# Altium footprint library 20210518.PcbLib: 414 footprints (part 3 of 26)
Each footprint in its own frame and in the unit in brackets; x right, y up, seen from the top. Pads: shape width x height; smd on the part's side, far side on the other; paste and mask are expansions set on the pad; w line width, h text height; cw(c..) or ccw(c..) is an arc to the next point about the centre after c.
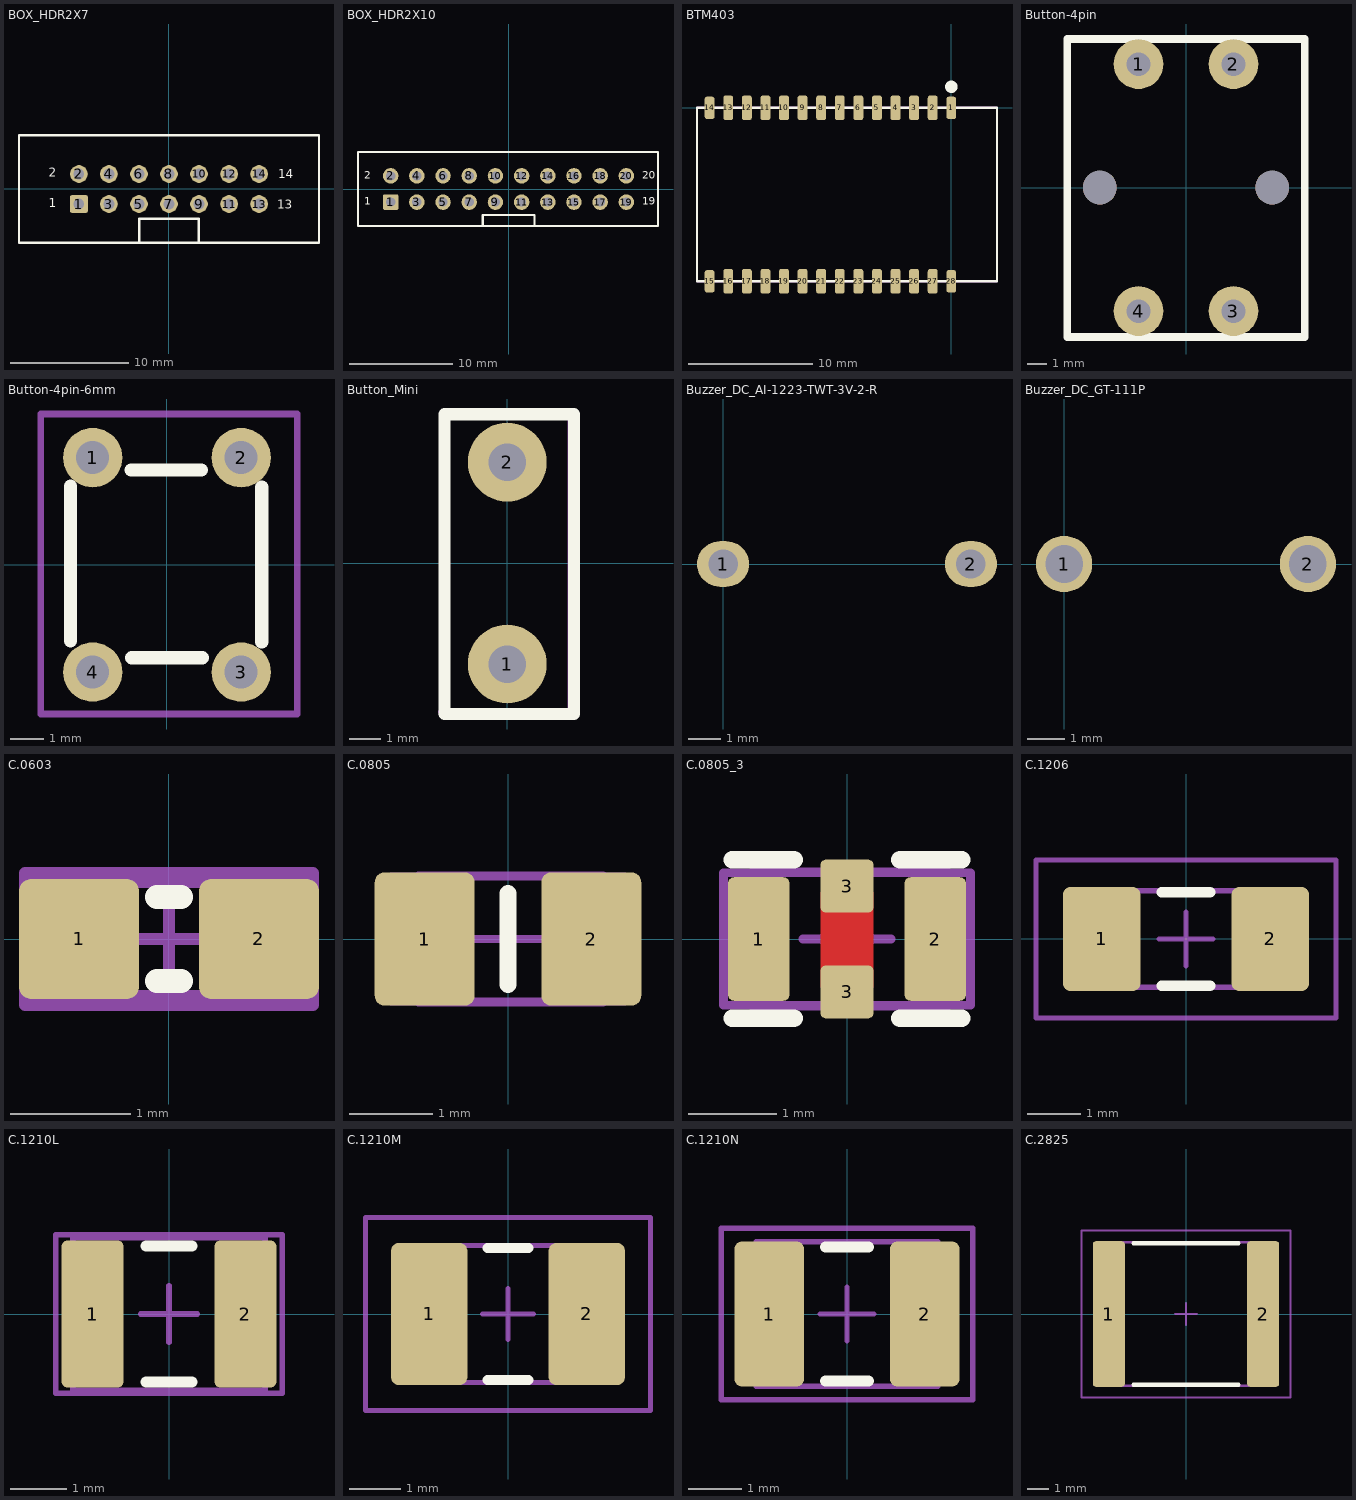
[diagram p2: the footprints below, top view; thin cyan lines are the x and y axes]

## BOX_HDR2X7 [mm] "Connector; Box Header; 7x2 Position"
height 9
pads (14):
  rrect20% 1.5x1.5 hole 0.9: 1(-7.62,-1.27)
  round 1.5 hole 0.9: 2(-7.62,1.27) 3(-5.08,-1.27) 4(-5.08,1.27) 5(-2.54,-1.27) 6(-2.54,1.27) 7(0,-1.27) 8(0,1.27) 9(2.54,-1.27) 10(2.54,1.27) 11(5.08,-1.27) 12(5.08,1.27) 13(7.62,-1.27) 14(7.62,1.27)
Top Overlay:
  lines w0.2: -2.525,-4.55 -2.525,-2.525 2.525,-2.525 2.525,-4.55 ; -12.69,-4.55 -12.69,4.55 -4.975,4.55 12.675,4.55 12.69,4.535 12.69,-4.55 -4.975,-4.55 -12.69,-4.55
  text "2" at -10.16,0.762 h1.27
  text "1" at -10.16,-1.778 h1.27
  text "13" at 9.175,-1.925 h1.27
  text "14" at 9.25,0.65 h1.27
3D body: height 8.8, standoff -3, extent -12.63,-4.5 12.65,4.9

## BOX_HDR2X10 [mm] "Connector; Box Header; 10x2 Position"
height 9
pads (20):
  rrect20% 1.5x1.5 hole 0.9: 1(-11.43,-1.27)
  round 1.5 hole 0.9: 2(-11.43,1.27) 3(-8.89,-1.27) 4(-8.89,1.27) 5(-6.35,-1.27) 6(-6.35,1.27) 7(-3.81,-1.27) 8(-3.81,1.27) 9(-1.27,-1.27) 10(-1.27,1.27) 11(1.27,-1.27) 12(1.27,1.27) 13(3.81,-1.27) 14(3.81,1.27) 15(6.35,-1.27) 16(6.35,1.27) 17(8.89,-1.27) 18(8.89,1.27) 19(11.43,-1.27) 20(11.43,1.27)
Top Overlay:
  lines w0.2: -2.5,-3.6 -2.5,-2.525 2.5,-2.525 2.5,-3.6 ; -14.6,-3.6 -7.835,-3.6 14.5,-3.6 14.5,3.6 -7.835,3.6 -14.6,3.6 -14.6,-3.6
  text "20" at 12.954,0.762 h1.27
  text "19" at 12.954,-1.778 h1.27
  text "1" at -13.97,-1.778 h1.27
  text "2" at -13.97,0.762 h1.27
3D body: height 8.5, standoff -2.6, extent -12.85,-2.525 12.85,2.475

## BTM403 [mm] "Bluetooth Module"
height 2.6
pads (28):
  rrect50% 0.8x1.8 smd: 1(0,0) 14(-19.5,0) 15(-19.5,-14) 28(0,-14)
  rrect50% 0.8x2 smd: 2(-1.5,0) 3(-3,0) 4(-4.5,0) 5(-6,0) 6(-7.5,0) 7(-9,0) 8(-10.5,0) 9(-12,0) 10(-13.5,0) 11(-15,0) 12(-16.5,0) 13(-18,0) 16(-18,-14) 17(-16.5,-14) 18(-15,-14) 19(-13.5,-14) 20(-12,-14) 21(-10.5,-14) 22(-9,-14) 23(-7.5,-14) 24(-6,-14) 25(-4.5,-14) 26(-3,-14) 27(-1.5,-14)
Top Overlay:
  circle w0.6: c0,1.7 r0.2
  lines w0.2: -20.52,-14 -20.52,0 3.69,0 3.69,-14 -20.52,-14
Mechanical 15:
  lines w0.2: -20.52,-14 -20.52,0 3.69,0 3.69,-14 -20.52,-14
3D body: height 2.5, standoff 0, extent -20.4,-14 14.9,0

## Button-4pin [mm] "4pin EKO'da kullanýlan Buton"
pads (6):
  round 2.54 hole 1.2: 1(-2.419,6.29) 2(2.419,6.29) 3(2.419,-6.29) 4(-2.419,-6.29)
  round 1.72 hole 1.72 mask+0: ""(-4.39,0) ""(4.39,0)
Top Overlay:
  lines w0.4: -6.049,-7.615 6.048,-7.615 6.048,7.571 -6.049,7.571 -6.049,-7.615
Mechanical 15:
  lines w0.203: -6.049,-7.715 -6.049,7.571 6.048,7.571 6.048,-7.715 0.517,-7.715 -6.049,-7.715
3D body: height 4.3, standoff -3.5, extent -6.009,-6.873 5.991,6.927

## Button-4pin-6mm [mm] "6mm*6mm button"
pads (4):
  round 1.8 hole 1: 1(-2.25,3.25) 2(2.25,3.25) 3(2.25,-3.25) 4(-2.25,-3.25)
Top Overlay:
  lines w0.4: -2.921,-2.311 -2.921,2.388 ; -1.092,2.87 1.041,2.87 ; -1.067,-2.819 1.067,-2.819 ; 2.87,-2.337 2.87,2.362
Mechanical 15:
  lines w0.203: -3.825,-4.522 -3.825,4.571 3.948,4.571 3.948,-4.522 -3.825,-4.522
3D body: height 5.01, standoff -3.51, extent -3.015,-3.871 3.015,3.872

## Button_Mini [mm]
pads (2):
  round 2.54 / inner round 1.2 / far side round 2.54 hole 1.2: 1(0,-3.25) 2(0,3.25)
Top Overlay:
  lines w0.4: -2.019,-4.855 -2.019,4.787 2.148,4.787 2.148,-4.855 -2.019,-4.855
Mechanical 13:
  lines w0.203: -2.019,-4.835 2.047,-4.835 2.047,4.736 -2.019,4.736 -2.019,-4.835
Mechanical 15:
  lines w0.254: -2.1,-4.8 2.1,-4.8 2.1,4.8 -2,4.8 -2,-4.7
3D body: height 4.26, standoff -0.3, extent -1.4,-3.1 1.6,2.9

## Buzzer_DC_AI-1223-TWT-3V-2-R [mm] "AUDIO MAGNETIC INDICATOR 2-4V TH"
height 7.5
pads (2):
  oval 1.6x1.4 hole 0.9: 1(0,0) 2(7.6,0)
3D body: height 0, standoff -4.5, extent 7.104,-0.499 8.1,0.499
3D body: height 0, standoff -6.5, extent -0.496,-0.499 0.5,0.499
3D body: height 7.6, standoff 0.1, extent -4,-8 12,8

## Buzzer_DC_GT-111P [mm] "AUDIO MAGNETIC XDCR 1-4V TH"
height 8.5
pads (2):
  round 1.5 hole 1: 1(0,0) 2(6.5,0)
3D body: height 10.51, standoff -1.3, extent -2.76,-6.04 9.24,5.96

## C.0603 [mm] "Chip Capacitor, Body 1.6x0.8mm, IPC High Density"
height 0.8
pads (2):
  rrect20% 1x1 smd: 1(-0.75,0) 2(0.75,0)
Top Overlay:
  lines w0.2: -0.1,-0.35 0.1,-0.35 ; -0.1,0.35 0.1,0.35
Mechanical 13:
  lines w0.1: -0.85,-0.475 -0.85,0.475 0.85,0.475 0.85,-0.475 -0.85,-0.475
Mechanical 15:
  lines w0.1: -0.475,0 0.475,0 ; 0,-0.475 0,0.475 ; -1.2,-0.55 -1.2,0.55 1.2,0.55 1.2,-0.55 -1.2,-0.55
3D body: height 0.3, standoff 0, extent -0.8,-0.4 0.8,0.4

## C.0805 [mm] "Chip Capacitor, Body 2.0x1.3mm, IPC High Density"
height 0.8
pads (2):
  rrect20% 1.2x1.6 smd: 1(-1,0) 2(1,0)
Top Overlay:
  lines w0.2: 0,-0.55 0,0.55
Mechanical 13:
  lines w0.1: -1.075,-0.762 -1.075,0.762 1.143,0.762 1.143,-0.762 -1.075,-0.762
Mechanical 15:
  lines w0.1: -0.5,0 0.5,0 ; 0,-0.5 0,0.5 ; -1.4,-0.75 -1.4,0.75 1.4,0.75 1.4,-0.75 -1.4,-0.75
3D body: height 0.78, standoff 0, extent -1,-0.625 1,0.625

## C.0805_3 [mm] "Chip Capacitor, Body 2.0x1.3mm, IPC High Density"
height 0.8
pads (4):
  rrect20% 0.7x1.4 smd: 1(-1,0) 2(1,0)
  rrect20% 0.6x0.6 smd: 3(0,-0.6) 3(0,0.6)
Top Layer:
  lines w0.6: 0,-0.508 0,0.492
Top Overlay:
  lines w0.2: -1.3,-0.9 -0.6,-0.9 ; -1.3,0.9 -0.6,0.9 ; 0.6,-0.9 1.3,-0.9 ; 0.6,0.9 1.3,0.9
Mechanical 13:
  lines w0.1: -1.075,-0.762 -1.075,0.762 1.143,0.762 1.143,-0.762 -1.075,-0.762
Mechanical 15:
  lines w0.1: -0.5,0 0.5,0 ; 0,-0.5 0,0.5 ; -1.4,-0.75 -1.4,0.75 1.4,0.75 1.4,-0.75 -1.4,-0.75
3D body: height 0.85, standoff 0, extent -1,-0.625 1,0.625

## C.1206 [mm] "Chip Capacitor, 2-Leads, Body 3,2x1,6mm, IPC Low Density"
height 1.6
pads (2):
  rrect20% 1.45x1.95 smd: 1(-1.575,0) 2(1.575,0)
Top Overlay:
  lines w0.2: -0.45,-0.875 0.45,-0.875 ; -0.45,0.875 0.45,0.875
Mechanical 13:
  lines w0.1: -1.7,-0.9 1.7,-0.9 1.7,0.9 -1.7,0.9 -1.7,-0.9
Mechanical 15:
  lines w0.1: -0.5,0 0.5,0 ; 0,-0.5 0,0.5 ; -2.8,-1.475 2.8,-1.475 2.8,1.475 -2.8,1.475 -2.8,-1.475
3D body: height 1, standoff 0, extent -1.6,-0.8 1.6,0.8

## C.1210L [mm] "Chip Capacitor, Body 3.2x2.5mm, IPC High Density"
height 1.5
pads (2):
  rrect20% 1.1x2.6 smd: 1(-1.35,0) 2(1.35,0)
Top Overlay:
  lines w0.2: -0.4,-1.2 0.4,-1.2 ; -0.4,1.2 0.4,1.2
Mechanical 13:
  lines w0.1: -1.7,-1.35 -1.7,1.35 1.7,1.35 1.7,-1.35 -1.7,-1.35
Mechanical 15:
  lines w0.1: -0.5,0 0.5,0 ; 0,-0.5 0,0.5 ; -2,-1.4 -2,1.4 2,1.4 2,-1.4 -2,-1.4
3D body: height 2.5, standoff 0, extent -1.6,-1.25 1.6,1.25

## C.1210M [mm] "Chip Capacitor, Body 3.2x2.5mm, IPC Low Density"
height 1.5
pads (2):
  rrect20% 1.5x2.8 smd: 1(-1.55,0) 2(1.55,0)
Top Overlay:
  lines w0.2: -0.4,-1.3 0.4,-1.3 ; -0.4,1.3 0.4,1.3
Mechanical 13:
  lines w0.1: -1.7,-1.35 -1.7,1.35 1.7,1.35 1.7,-1.35 -1.7,-1.35
Mechanical 15:
  lines w0.1: -0.5,0 0.5,0 ; 0,-0.5 0,0.5 ; -2.8,-1.9 -2.8,1.9 2.8,1.9 2.8,-1.9 -2.8,-1.9
3D body: height 2.5, standoff 0, extent -1.6,-1.25 1.6,1.25

## C.1210N [mm] "Chip Capacitor, Body 3.2x2.5mm, IPC Medium Density"
height 1.5
pads (2):
  rrect20% 1.3x2.7 smd: 1(-1.45,0) 2(1.45,0)
Top Overlay:
  lines w0.2: -0.4,-1.25 0.4,-1.25 ; -0.4,1.25 0.4,1.25
Mechanical 13:
  lines w0.1: -1.7,-1.35 1.7,-1.35 1.7,1.35 -1.7,1.35 -1.7,-1.35
Mechanical 15:
  lines w0.1: -0.5,0 0.5,0 ; 0,-0.5 0,0.5 ; -2.35,-1.6 2.35,-1.6 2.35,1.6 -2.35,1.6 -2.35,-1.6
3D body: height 2.5, standoff 0, extent -1.6,-1.25 1.6,1.25

## C.2825 [mm] "Chip Capacitor, 2-Leads, Body 7,1x6,3mm, IPC Low Density"
height 5
pads (2):
  rrect20% 1.5x6.8 smd: 1(-3.6,0) 2(3.6,0)
Top Overlay:
  lines w0.2: -2.45,-3.3 2.45,-3.3 ; -2.45,3.3 2.45,3.3
Mechanical 13:
  lines w0.1: -3.75,-3.35 3.75,-3.35 3.75,3.35 -3.75,3.35 -3.75,-3.35
Mechanical 15:
  lines w0.1: -0.5,0 0.5,0 ; 0,-0.5 0,0.5 ; -4.875,-3.9 4.875,-3.9 4.875,3.9 -4.875,3.9 -4.875,-3.9